# Altium footprint library PCB_CONNECTORS.PcbLib: 676 footprints (part 5 of 43)
Each footprint in its own frame and in the unit in brackets; x right, y up, seen from the top. Pads: shape width x height; smd on the part's side, far side on the other; paste and mask are expansions set on the pad; w line width, h text height; cw(c..) or ccw(c..) is an arc to the next point about the centre after c.
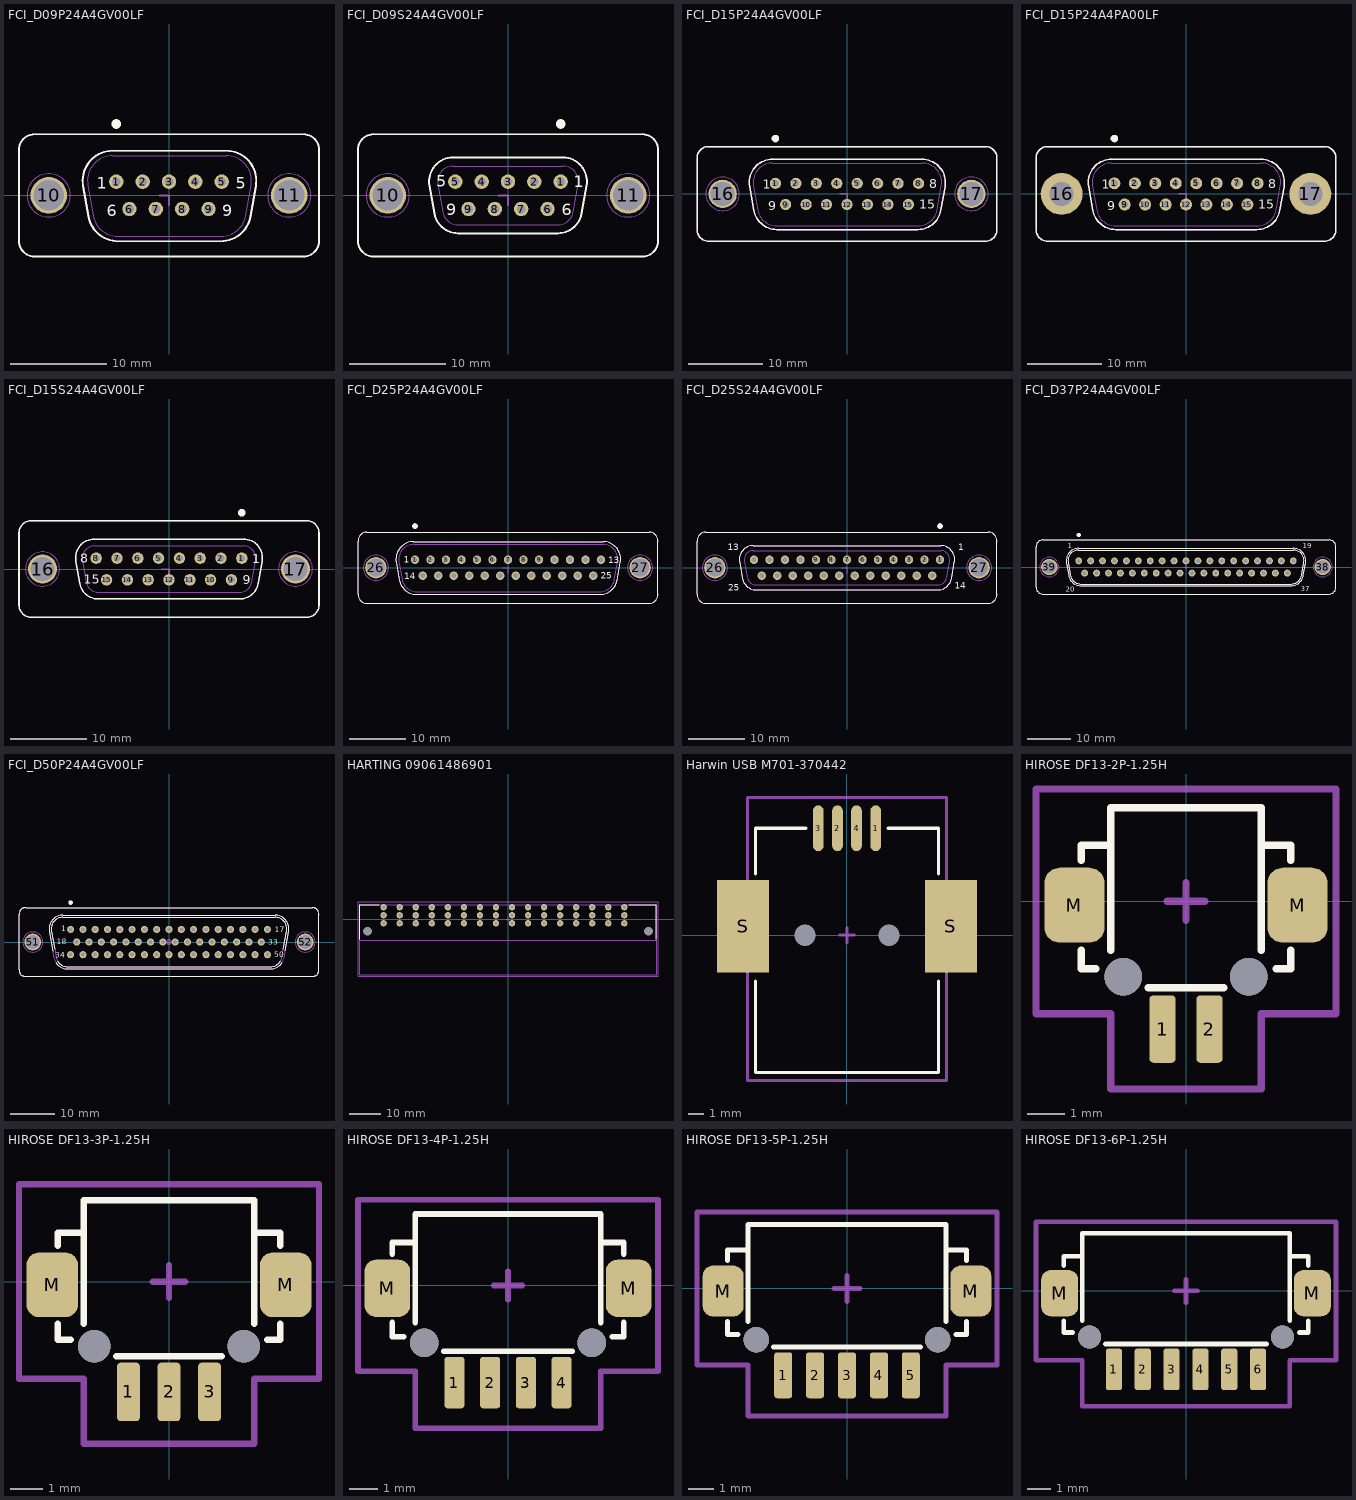
[diagram p4: the footprints below, top view; thin cyan lines are the x and y axes]

## FCI_D09P24A4GV00LF [mm] "Straight D-SUB 9 Male Contacts for PCB  with Harpoons and Female Screwlock (UNC4-40) and Elec. Continuity"
height 12.25
pads (11):
  round 1.5 hole 0.9: 1(-5.48,1.42) 2(-2.74,1.42) 3(0,1.42) 4(2.74,1.42) 5(5.48,1.42) 6(-4.11,-1.42) 7(-1.37,-1.42) 8(1.37,-1.42) 9(4.11,-1.42)
  round 3.8 hole 3.2: 10(-12.495,0) 11(12.495,0)
Top Overlay:
  circle w0.5: c-5.48,7.42 r0.25
  lines w0.2: -15.595,-4.75 ccw(c-13.995,-4.75) -13.995,-6.35 13.995,-6.35 ccw(c13.995,-4.75) 15.595,-4.75 15.595,4.75 ccw(c13.995,4.75) 13.995,6.35 -13.995,6.35 ccw(c-13.995,4.75) -15.595,4.75 -15.595,-4.75 ; -8.928,0.978 cw(c-5.855,1.52) -5.855,4.64 5.955,4.64 cw(c5.955,1.52) 9.028,0.978 8.469,-2.192 cw(c5.396,-1.65) 5.396,-4.77 -5.296,-4.77 cw(c-5.296,-1.65) -8.369,-2.192 -8.928,0.978
  text "9" at 5.535,-2.17 h1.2
  text "1" at -7.505,0.67 h1.2
  text "5" at 6.93,0.695 h1.2
  text "6" at -6.46,-2.17 h1.2
Mechanical 8:
  lines w0.2: -1,0 0,0 0,-1
Mechanical 14:
  circle w0.1: c12.495,0 r2.25
  circle w0.1: c-12.495,0 r2.25
  lines w0.1: -15.595,-4.75 ccw(c-13.995,-4.75) -13.995,-6.35 13.995,-6.35 ccw(c13.995,-4.75) 15.595,-4.75 15.595,4.75 ccw(c13.995,4.75) 13.995,6.35 -13.995,6.35 ccw(c-13.995,4.75) -15.595,4.75 -15.595,-4.75 ; -8.928,0.978 cw(c-5.855,1.52) -5.855,4.64 5.955,4.64 cw(c5.955,1.52) 9.028,0.978 8.469,-2.192 cw(c5.396,-1.65) 5.396,-4.77 -5.296,-4.77 cw(c-5.296,-1.65) -8.369,-2.192 -8.928,0.978 ; -8.435,1.065 cw(c-5.855,1.52) -5.855,4.14 5.955,4.14 cw(c5.955,1.52) 8.535,1.065 7.976,-2.105 cw(c5.396,-1.65) 5.396,-4.27 -5.296,-4.27 cw(c-5.296,-1.65) -7.876,-2.105 -8.435,1.065
  text "9 D-Sub Male" at -6.053,4.872 h1.2
  text "6" at -6.46,-2.17 h1.2
  text "5" at 6.93,0.695 h1.2
  text "1" at -7.505,0.67 h1.2
  text "9" at 5.535,-2.17 h1.2
3D body "FCI_D09P24A4GV00LF.stp": height 12, standoff -3, extent -15.495,-6.275 15.495,6.275

## FCI_D09S24A4GV00LF [mm] "Straight D-SUB 9 Female Contacts for PCB  with Harpoons and Female Screwlock (UNC4-40) and Elec. Continuity"
height 12.39
pads (11):
  round 1.5 hole 0.9: 1(5.48,1.42) 2(2.74,1.42) 3(0,1.42) 4(-2.74,1.42) 5(-5.48,1.42) 6(4.11,-1.42) 7(1.37,-1.42) 8(-1.37,-1.42) 9(-4.11,-1.42)
  round 3.8 hole 3.2: 10(-12.495,0) 11(12.495,0)
Top Overlay:
  circle w0.5: c5.48,7.42 r0.25
  lines w0.2: -15.595,-4.75 ccw(c-13.995,-4.75) -13.995,-6.35 13.995,-6.35 ccw(c13.995,-4.75) 15.595,-4.75 15.595,4.75 ccw(c13.995,4.75) 13.995,6.35 -13.995,6.35 ccw(c-13.995,4.75) -15.595,4.75 -15.595,-4.75 ; -8.167,1.011 cw(c-5.705,1.445) -5.705,3.945 5.705,3.945 cw(c5.705,1.445) 8.167,1.011 7.657,-1.879 cw(c5.195,-1.445) 5.195,-3.945 -5.195,-3.945 cw(c-5.195,-1.445) -7.657,-1.879 -8.167,1.011
  text "9" at -6.41,-2.045 h1.2
  text "6" at 5.585,-2.045 h1.2
  text "5" at -7.48,0.895 h1.2
  text "1" at 6.855,0.82 h1.2
Mechanical 8:
  lines w0.2: -1,0 0,0 0,-1
Mechanical 14:
  circle w0.1: c-12.495,0 r2.25
  circle w0.1: c12.495,0 r2.25
  lines w0.1: -15.595,-4.75 ccw(c-13.995,-4.75) -13.995,-6.35 13.995,-6.35 ccw(c13.995,-4.75) 15.595,-4.75 15.595,4.75 ccw(c13.995,4.75) 13.995,6.35 -13.995,6.35 ccw(c-13.995,4.75) -15.595,4.75 -15.595,-4.75 ; -8.167,1.011 cw(c-5.705,1.445) -5.705,3.945 5.705,3.945 cw(c5.705,1.445) 8.167,1.011 7.657,-1.879 cw(c5.195,-1.445) 5.195,-3.945 -5.195,-3.945 cw(c-5.195,-1.445) -7.657,-1.879 -8.167,1.011 ; -7.291,1.167 cw(c-5.715,1.445) -5.715,3.045 5.715,3.045 cw(c5.715,1.445) 7.291,1.167 6.781,-1.723 cw(c5.205,-1.445) 5.205,-3.045 -5.205,-3.045 cw(c-5.205,-1.445) -6.781,-1.723 -7.291,1.167
  text "1" at 8.85,1 h1.2
  text "5" at -9.525,1 h1.2
  text "6" at 8.525,-2.05 h1.2
  text "9" at -9.5,-2.025 h1.2
  text "9 D-Sub Female" at -6.178,4.472 h1.2
3D body "FCI_D09S24A4GV00LF.stp": height 12.1, standoff -3, extent -15.495,-6.653 15.495,6.21

## FCI_D15P24A4GV00LF [mm] "Straight D-SUB 15 Male Contacts for PCB  with Harpoons and Female Screwlock (UNC4-40) and Elec. Continuity"
height 12.25
pads (17):
  round 1.5 hole 0.9: 1(-9.59,1.42) 2(-6.85,1.42) 3(-4.11,1.42) 4(-1.37,1.42) 5(1.37,1.42) 6(4.11,1.42) 7(6.85,1.42) 8(9.59,1.42) 9(-8.22,-1.42) 10(-5.48,-1.42) 11(-2.74,-1.42) 12(0,-1.42) 13(2.74,-1.42) 14(5.48,-1.42) 15(8.22,-1.42)
  round 3.8 hole 3.2: 16(-16.66,0) 17(16.66,0)
Top Overlay:
  circle w0.5: c-9.59,7.42 r0.25
  lines w0.2: -20.095,-4.75 ccw(c-18.495,-4.75) -18.495,-6.35 18.495,-6.35 ccw(c18.495,-4.75) 20.095,-4.75 20.095,4.75 ccw(c18.495,4.75) 18.495,6.35 -18.495,6.35 ccw(c-18.495,4.75) -20.095,4.75 -20.095,-4.75 ; -13.038,0.978 cw(c-9.965,1.52) -9.965,4.64 10.065,4.64 cw(c10.065,1.52) 13.138,0.978 12.579,-2.192 cw(c9.506,-1.65) 9.506,-4.77 -9.406,-4.77 cw(c-9.406,-1.65) -12.479,-2.192 -13.038,0.978
  text "8" at 11.04,0.77 h1.2
  text "9" at -10.52,-2.17 h1.2
  text "1" at -11.29,0.67 h1.2
  text "15" at 9.695,-1.995 h1.2
Mechanical 8:
  lines w0.2: -1,0 0,0 0,-1
Mechanical 14:
  circle w0.1: c-16.66,0 r2.25
  circle w0.1: c16.66,0 r2.25
  lines w0.1: -20.095,-4.75 ccw(c-18.495,-4.75) -18.495,-6.35 18.495,-6.35 ccw(c18.495,-4.75) 20.095,-4.75 20.095,4.75 ccw(c18.495,4.75) 18.495,6.35 -18.495,6.35 ccw(c-18.495,4.75) -20.095,4.75 -20.095,-4.75 ; -13.038,0.978 cw(c-9.965,1.52) -9.965,4.64 10.065,4.64 cw(c10.065,1.52) 13.138,0.978 12.579,-2.192 cw(c9.506,-1.65) 9.506,-4.77 -9.406,-4.77 cw(c-9.406,-1.65) -12.479,-2.192 -13.038,0.978 ; -12.545,1.065 cw(c-9.965,1.52) -9.965,4.14 10.065,4.14 cw(c10.065,1.52) 12.645,1.065 12.086,-2.105 cw(c9.506,-1.65) 9.506,-4.27 -9.406,-4.27 cw(c-9.406,-1.65) -11.986,-2.105 -12.545,1.065
  text "15 D-Sub Male" at -6.028,4.847 h1.2
  text "15" at 9.695,-1.995 h1.2
  text "1" at -11.29,0.67 h1.2
  text "9" at -10.52,-2.17 h1.2
  text "8" at 11.04,0.77 h1.2
3D body "FCI_D15P24A4GV00LF.stp": height 12, standoff -3, extent -19.66,-6.275 19.66,6.275

## FCI_D15P24A4PA00LF [mm] "Straight D-SUB 15 Male Contacts for PCB  without Harpoons and without Female Screwlock"
height 12.25
pads (17):
  round 1.6 hole 0.9: 1(-9.59,1.42) 2(-6.85,1.42) 3(-4.11,1.42) 4(-1.37,1.42) 5(1.37,1.42) 6(4.11,1.42) 7(6.85,1.42) 8(9.59,1.42) 9(-8.22,-1.42) 10(-5.48,-1.42) 11(-2.74,-1.42) 12(0,-1.42) 13(2.74,-1.42) 14(5.48,-1.42) 15(8.22,-1.42)
  round 5.6 hole 3.2: 16(-16.66,0) 17(16.66,0)
Top Overlay:
  circle w0.5: c-9.59,7.42 r0.25
  lines w0.2: -20.095,-4.75 ccw(c-18.495,-4.75) -18.495,-6.35 18.495,-6.35 ccw(c18.495,-4.75) 20.095,-4.75 20.095,4.75 ccw(c18.495,4.75) 18.495,6.35 -18.495,6.35 ccw(c-18.495,4.75) -20.095,4.75 -20.095,-4.75 ; -13.038,0.978 cw(c-9.965,1.52) -9.965,4.64 10.065,4.64 cw(c10.065,1.52) 13.138,0.978 12.579,-2.192 cw(c9.506,-1.65) 9.506,-4.77 -9.406,-4.77 cw(c-9.406,-1.65) -12.479,-2.192 -13.038,0.978
  text "15" at 9.695,-1.995 h1.2
  text "1" at -11.29,0.67 h1.2
  text "9" at -10.52,-2.17 h1.2
  text "8" at 11.04,0.77 h1.2
Mechanical 8:
  lines w0.2: -1,0 0,0 0,-1
Mechanical 14:
  circle w0.1: c16.66,0 r2.25
  circle w0.1: c-16.66,0 r2.25
  lines w0.1: -20.095,-4.75 ccw(c-18.495,-4.75) -18.495,-6.35 18.495,-6.35 ccw(c18.495,-4.75) 20.095,-4.75 20.095,4.75 ccw(c18.495,4.75) 18.495,6.35 -18.495,6.35 ccw(c-18.495,4.75) -20.095,4.75 -20.095,-4.75 ; -13.038,0.978 cw(c-9.965,1.52) -9.965,4.64 10.065,4.64 cw(c10.065,1.52) 13.138,0.978 12.579,-2.192 cw(c9.506,-1.65) 9.506,-4.77 -9.406,-4.77 cw(c-9.406,-1.65) -12.479,-2.192 -13.038,0.978 ; -12.545,1.065 cw(c-9.965,1.52) -9.965,4.14 10.065,4.14 cw(c10.065,1.52) 12.645,1.065 12.086,-2.105 cw(c9.506,-1.65) 9.506,-4.27 -9.406,-4.27 cw(c-9.406,-1.65) -11.986,-2.105 -12.545,1.065
  text "8" at 11.04,0.77 h1.2
  text "9" at -10.52,-2.17 h1.2
  text "1" at -11.29,0.67 h1.2
  text "15" at 9.695,-1.995 h1.2
  text "15 D-Sub Male" at -6.028,4.847 h1.2
3D body "FCI_D15P24A4PA00LF.stp": height 11.9, standoff -2, extent -19.66,-6.275 19.66,6.275

## FCI_D15S24A4GV00LF [mm] "Straight D-SUB 15 Female Contacts for PCB  with Harpoons and Female Screwlock (UNC4-40) and Elec. Continuity"
height 12.39
pads (17):
  round 1.5 hole 0.9: 1(9.59,1.42) 2(6.85,1.42) 3(4.11,1.42) 4(1.37,1.42) 5(-1.37,1.42) 6(-4.11,1.42) 7(-6.85,1.42) 8(-9.59,1.42) 9(8.22,-1.42) 10(5.48,-1.42) 11(2.74,-1.42) 12(0,-1.42) 13(-2.74,-1.42) 14(-5.48,-1.42) 15(-8.22,-1.42)
  round 3.8 hole 3.2: 16(-16.66,0) 17(16.66,0)
Top Overlay:
  circle w0.5: c9.59,7.42 r0.25
  lines w0.2: -19.76,-4.75 ccw(c-18.16,-4.75) -18.16,-6.35 18.16,-6.35 ccw(c18.16,-4.75) 19.76,-4.75 19.76,4.75 ccw(c18.16,4.75) 18.16,6.35 -18.16,6.35 ccw(c-18.16,4.75) -19.76,4.75 -19.76,-4.75 ; -12.277,1.011 cw(c-9.815,1.445) -9.815,3.945 9.815,3.945 cw(c9.815,1.445) 12.277,1.011 11.767,-1.879 cw(c9.305,-1.445) 9.305,-3.945 -9.305,-3.945 cw(c-9.305,-1.445) -11.767,-1.879 -12.277,1.011
  text "9" at 9.695,-1.995 h1.2
  text "1" at 10.965,0.77 h1.2
  text "8" at -11.69,0.82 h1.2
  text "15" at -11.22,-1.945 h1.2
Mechanical 8:
  lines w0.2: -1,0 0,0 0,-1
Mechanical 14:
  circle w0.1: c-16.66,0 r2.25
  circle w0.1: c16.66,0 r2.25
  lines w0.1: -19.76,-4.75 ccw(c-18.16,-4.75) -18.16,-6.35 18.16,-6.35 ccw(c18.16,-4.75) 19.76,-4.75 19.76,4.75 ccw(c18.16,4.75) 18.16,6.35 -18.16,6.35 ccw(c-18.16,4.75) -19.76,4.75 -19.76,-4.75 ; -12.277,1.011 cw(c-9.815,1.445) -9.815,3.945 9.815,3.945 cw(c9.815,1.445) 12.277,1.011 11.767,-1.879 cw(c9.305,-1.445) 9.305,-3.945 -9.305,-3.945 cw(c-9.305,-1.445) -11.767,-1.879 -12.277,1.011 ; -11.401,1.167 cw(c-9.825,1.445) -9.825,3.045 9.825,3.045 cw(c9.825,1.445) 11.401,1.167 10.891,-1.723 cw(c9.315,-1.445) 9.315,-3.045 -9.315,-3.045 cw(c-9.315,-1.445) -10.891,-1.723 -11.401,1.167
  text "15" at -14.17,-2.045 h1.2
  text "8" at -13.715,0.945 h1.2
  text "1" at 12.99,1.095 h1.2
  text "9" at 12.845,-2.07 h1.2
  text "15 D-Sub Female" at -6.278,4.522 h1.2
3D body "FCI_D15S24A4GV00LF.stp": height 12.1, standoff -3, extent -19.66,-6.275 19.66,6.275

## FCI_D25P24A4GV00LF [mm] "Straight D-SUB 25 Male Contacts for PCB  with Harpoons and Female Screwlock (UNC4-40) and Elec. Continuity"
height 12.05
pads (27):
  round 1.5 hole 0.9: 1(-16.56,1.42) 2(-13.8,1.42) 3(-11.04,1.42) 4(-8.28,1.42) 5(-5.52,1.42) 6(-2.76,1.42) 7(0,1.42) 8(2.76,1.42) 9(5.52,1.42) 10(8.28,1.42) 11(11.04,1.42) 12(13.8,1.42) 13(16.56,1.42) 14(-15.18,-1.42) 15(-12.42,-1.42) 16(-9.66,-1.42) 17(-6.9,-1.42) 18(-4.14,-1.42) 19(-1.38,-1.42) 20(1.38,-1.42) 21(4.14,-1.42) 22(6.9,-1.42) 23(9.66,-1.42) 24(12.42,-1.42) 25(15.18,-1.42)
  round 3.8 hole 3.2: 26(-23.52,0) 27(23.52,0)
Top Overlay:
  circle w0.5: c-16.56,7.42 r0.25
  lines w0.2: -26.705,-4.75 ccw(c-25.105,-4.75) -25.105,-6.35 25.105,-6.35 ccw(c25.105,-4.75) 26.705,-4.75 26.705,4.75 ccw(c25.105,4.75) 25.105,6.35 -25.105,6.35 ccw(c-25.105,4.75) -26.705,4.75 -26.705,-4.75 ; -19.903,0.978 cw(c-16.83,1.52) -16.83,4.64 16.93,4.64 cw(c16.93,1.52) 20.003,0.978 19.444,-2.192 cw(c16.371,-1.65) 16.371,-4.77 -16.271,-4.77 cw(c-16.271,-1.65) -19.344,-2.192 -19.903,0.978
  text "25" at 16.55,-1.925 h1.2
  text "1" at -18.575,0.85 h1.2
  text "13" at 17.825,0.825 h1.2
  text "14" at -18.475,-2.05 h1.2
Mechanical 8:
  lines w0.2: -1,0 0,0 0,-1
Mechanical 14:
  circle w0.1: c23.52,0 r2.25
  circle w0.1: c-23.52,0 r2.25
  lines w0.1: -26.705,-4.75 ccw(c-25.105,-4.75) -25.105,-6.35 25.105,-6.35 ccw(c25.105,-4.75) 26.705,-4.75 26.705,4.75 ccw(c25.105,4.75) 25.105,6.35 -25.105,6.35 ccw(c-25.105,4.75) -26.705,4.75 -26.705,-4.75 ; -19.903,0.978 cw(c-16.83,1.52) -16.83,4.64 16.93,4.64 cw(c16.93,1.52) 20.003,0.978 19.444,-2.192 cw(c16.371,-1.65) 16.371,-4.77 -16.271,-4.77 cw(c-16.271,-1.65) -19.344,-2.192 -19.903,0.978 ; -19.41,1.065 cw(c-16.83,1.52) -16.83,4.14 16.93,4.14 cw(c16.93,1.52) 19.51,1.065 18.951,-2.105 cw(c16.371,-1.65) 16.371,-4.27 -16.271,-4.27 cw(c-16.271,-1.65) -18.851,-2.105 -19.41,1.065
  text "25 D-Sub Male" at -6.478,4.872 h1.2
  text "14" at -18.475,-2.05 h1.2
  text "13" at 17.5,0.875 h1.2
  text "1" at -18.575,0.85 h1.2
  text "25" at 16.55,-1.925 h1.2
3D body "FCI_D25P24A4GV00LF.stp": height 12, standoff -3, extent -26.52,-6.275 26.52,6.275

## FCI_D25S24A4GV00LF [mm] "Straight D-SUB 25 Female Contacts for PCB  with Harpoons and Female Screwlock (UNC4-40) and Elec. Continuity"
height 12.39
pads (27):
  round 1.5 hole 0.9: 1(16.56,1.42) 2(13.8,1.42) 3(11.04,1.42) 4(8.28,1.42) 5(5.52,1.42) 6(2.76,1.42) 7(0,1.42) 8(-2.76,1.42) 9(-5.52,1.42) 10(-8.28,1.42) 11(-11.04,1.42) 12(-13.8,1.42) 13(-16.56,1.42) 14(15.18,-1.42) 15(12.42,-1.42) 16(9.66,-1.42) 17(6.9,-1.42) 18(4.14,-1.42) 19(1.38,-1.42) 20(-1.38,-1.42) 21(-4.14,-1.42) 22(-6.9,-1.42) 23(-9.66,-1.42) 24(-12.42,-1.42) 25(-15.18,-1.42)
  round 3.8 hole 3.2: 26(-23.52,0) 27(23.52,0)
Top Overlay:
  circle w0.5: c16.56,7.42 r0.25
  lines w0.2: -26.705,-4.75 ccw(c-25.105,-4.75) -25.105,-6.35 25.105,-6.35 ccw(c25.105,-4.75) 26.705,-4.75 26.705,4.75 ccw(c25.105,4.75) 25.105,6.35 -25.105,6.35 ccw(c-25.105,4.75) -26.705,4.75 -26.705,-4.75 ; -19.137,1.011 cw(c-16.675,1.445) -16.675,3.945 16.675,3.945 cw(c16.675,1.445) 19.137,1.011 18.627,-1.879 cw(c16.165,-1.445) 16.165,-3.945 -16.165,-3.945 cw(c-16.165,-1.445) -18.627,-1.879 -19.137,1.011
  text "25" at -21.1,-4.1 h1.2
  text "14" at 19.2,-3.75 h1.2
  text "1" at 19.775,3.1 h1.2
  text "13" at -21.225,3.125 h1.2
Mechanical 8:
  lines w0.2: -1,0 0,0 0,-1
Mechanical 14:
  circle w0.1: c-23.52,0 r2.25
  circle w0.1: c23.52,0 r2.25
  lines w0.1: -26.705,-4.75 ccw(c-25.105,-4.75) -25.105,-6.35 25.105,-6.35 ccw(c25.105,-4.75) 26.705,-4.75 26.705,4.75 ccw(c25.105,4.75) 25.105,6.35 -25.105,6.35 ccw(c-25.105,4.75) -26.705,4.75 -26.705,-4.75 ; -19.137,1.011 cw(c-16.675,1.445) -16.675,3.945 16.675,3.945 cw(c16.675,1.445) 19.137,1.011 18.627,-1.879 cw(c16.165,-1.445) 16.165,-3.945 -16.165,-3.945 cw(c-16.165,-1.445) -18.627,-1.879 -19.137,1.011 ; -18.261,1.167 cw(c-16.685,1.445) -16.685,3.045 16.685,3.045 cw(c16.685,1.445) 18.261,1.167 17.751,-1.723 cw(c16.175,-1.445) 16.175,-3.045 -16.175,-3.045 cw(c-16.175,-1.445) -17.751,-1.723 -18.261,1.167
  text "13" at -21.225,3.125 h1.2
  text "1" at 19.775,3.1 h1.2
  text "14" at 19.2,-3.75 h1.2
  text "25" at -21.1,-4.1 h1.2
  text "25 D-Sub Female" at -6.328,4.497 h1.2
3D body "FCI_D25S24A4GV00LF.stp": height 12.1, standoff -3, extent -26.52,-6.275 26.52,6.275

## FCI_D37P24A4GV00LF [mm] "Straight D-SUB 37 Male Contacts for PCB  with Harpoons and Female Screwlock (UNC4-40) and Elec. Continuity"
height 12.05
pads (39):
  round 1.6 hole 0.9: 1(-24.93,1.42) 2(-22.16,1.42) 3(-19.39,1.42) 4(-16.62,1.42) 5(-13.85,1.42) 6(-11.08,1.42) 7(-8.31,1.42) 8(-5.54,1.42) 9(-2.77,1.42) 10(0,1.42) 11(2.77,1.42) 12(5.54,1.42) 13(8.31,1.42) 14(11.08,1.42) 15(13.85,1.42) 16(16.62,1.42) 17(19.39,1.42) 18(22.16,1.42) 19(24.93,1.42) 20(-23.545,-1.42) 21(-20.775,-1.42) 22(-18.005,-1.42) 23(-15.235,-1.42) 24(-12.465,-1.42) 25(-9.695,-1.42) 26(-6.925,-1.42) 27(-4.155,-1.42) 28(-1.385,-1.42) 29(1.385,-1.42) 30(4.155,-1.42) 31(6.925,-1.42) 32(9.695,-1.42) 33(12.465,-1.42) 34(15.235,-1.42) 35(18.005,-1.42) 36(20.775,-1.42) 37(23.545,-1.42)
  round 3.8 hole 3.1: 38(31.75,0) 39(-31.75,0)
Top Overlay:
  circle w0.5: c-24.93,7.42 r0.25
  lines w0.2: -34.85,-4.675 ccw(c-33.25,-4.675) -33.25,-6.275 33.25,-6.275 ccw(c33.25,-4.675) 34.85,-4.675 34.85,4.675 ccw(c33.25,4.675) 33.25,6.275 -33.25,6.275 ccw(c-33.25,4.675) -34.85,4.675 -34.85,-4.675 ; -27.776,0.946 cw(c-24.92,1.45) -24.92,4.35 24.92,4.35 cw(c24.92,1.45) 27.776,0.946 27.265,-1.954 cw(c24.409,-1.45) 24.409,-4.35 -24.409,-4.35 cw(c-24.409,-1.45) -27.265,-1.954 -27.776,0.946 ; -27.382,1.016 cw(c-24.92,1.45) -24.92,3.95 24.92,3.95 cw(c24.92,1.45) 27.382,1.016 26.871,-1.884 cw(c24.409,-1.45) 24.409,-3.95 -24.409,-3.95 cw(c-24.409,-1.45) -26.871,-1.884 -27.382,1.016
  text "20" at -27.97,-5.692 h1.2
  text "1" at -27.475,4.393 h1.2
  text "19" at 27.093,4.393 h1.2
  text "37" at 26.609,-5.64 h1.2
Mechanical 8:
  drawing of 160 lines, arcs and shapes, not listed
Mechanical 14:
  circle w0.1: c-31.75,0 r2.25
  circle w0.1: c31.75,0 r2.25
  lines w0.1: -34.85,-4.675 ccw(c-33.25,-4.675) -33.25,-6.275 33.25,-6.275 ccw(c33.25,-4.675) 34.85,-4.675 34.85,4.675 ccw(c33.25,4.675) 33.25,6.275 -33.25,6.275 ccw(c-33.25,4.675) -34.85,4.675 -34.85,-4.675 ; -27.776,0.946 cw(c-24.92,1.45) -24.92,4.35 24.92,4.35 cw(c24.92,1.45) 27.776,0.946 27.265,-1.954 cw(c24.409,-1.45) 24.409,-4.35 -24.409,-4.35 cw(c-24.409,-1.45) -27.265,-1.954 -27.776,0.946 ; -27.382,1.016 cw(c-24.92,1.45) -24.92,3.95 24.92,3.95 cw(c24.92,1.45) 27.382,1.016 26.871,-1.884 cw(c24.409,-1.45) 24.409,-3.95 -24.409,-3.95 cw(c-24.409,-1.45) -26.871,-1.884 -27.382,1.016
  text "37" at 26.609,-5.64 h1.2
  text "19" at 27.093,4.393 h1.2
  text "1" at -27.475,4.393 h1.2
  text "20" at -27.97,-5.692 h1.2
  text "37 D-Sub Male" at -8.078,4.697 h1.2
3D body "FCI_D37P24A4GV00LF.stp": height 12, standoff -3.2, extent -34.85,-6.275 34.85,6.275

## FCI_D50P24A4GV00LF [mm] "Straight D-SUB 50 Male Contacts for PCB  with Harpoons and Female Screwlock (UNC4-40) and Elec. Continuity"
height 12.3
pads (52):
  round 1.6 hole 0.9: 1(-22.08,2.84) 2(-19.32,2.84) 3(-16.56,2.84) 4(-13.8,2.84) 5(-11.04,2.84) 6(-8.28,2.84) 7(-5.52,2.84) 8(-2.76,2.84) 9(0,2.84) 10(2.76,2.84) 11(5.52,2.84) 12(8.28,2.84) 13(11.04,2.84) 14(13.8,2.84) 15(16.56,2.84) 16(19.32,2.84) 17(22.08,2.84) 18(-20.7,0) 19(-17.94,0) 20(-15.18,0) 21(-12.42,0) 22(-9.66,0) 23(-6.9,0) 24(-4.14,0) 25(-1.38,0) 26(1.38,0) 27(4.14,0) 28(6.9,0) 29(9.66,0) 30(12.42,0) 31(15.18,0) 32(17.94,0) 33(20.7,0) 34(-22.08,-2.84) 35(-19.32,-2.84) 36(-16.56,-2.84) 37(-13.8,-2.84) 38(-11.04,-2.84) 39(-8.28,-2.84) 40(-5.52,-2.84) 41(-2.76,-2.84) 42(0,-2.84) 43(2.76,-2.84) 44(5.52,-2.84) 45(8.28,-2.84) 46(11.04,-2.84) 47(13.8,-2.84) 48(16.56,-2.84) 49(19.32,-2.84) 50(22.08,-2.84)
  round 3.8 hole 3.1: 51(-30.55,0) 52(30.55,0)
Top Overlay:
  circle w0.5: c-22.08,8.84 r0.25
  lines w0.2: -26.063,-2.11 -26.858,2.397 cw(c-23.805,2.935) -23.805,6.035 23.805,6.035 cw(c23.805,2.935) 26.858,2.397 26.082,-2.004 ; -25.647,-1.592 -26.366,2.484 cw(c-23.805,2.935) -23.805,5.535 23.805,5.535 cw(c23.805,2.935) 26.366,2.484 25.65,-1.575 ; -25.455,-4.485 ccw(c-22.77,-2.935) -22.77,-6.035 22.77,-6.035 ccw(c22.77,-2.935) 25.455,-4.485 ; -25.022,-4.235 ccw(c-22.77,-2.935) -22.77,-5.535 22.77,-5.535 ccw(c22.77,-2.935) 25.022,-4.235 ; -33.655,-6.23 ccw(c-32.155,-6.23) -32.155,-7.73 32.155,-7.73 ccw(c32.155,-6.23) 33.655,-6.23 33.655,6.23 ccw(c32.155,6.23) 32.155,7.73 -32.155,7.73 ccw(c-32.155,6.23) -33.655,6.23 -33.655,-6.23
  text "18" at -25.15,-0.55 h1.2
  text "34" at -25.515,-3.56 h1.2
  text "50" at 23.6,-3.45 h1.2
  text "33" at 22.275,-0.575 h1.2
  text "1" at -24.225,2.4 h1.2
  text "17" at 23.685,2.25 h1.2
Mechanical 8:
  drawing of 213 lines, arcs and shapes, not listed
Mechanical 14:
  circle w0.1: c-30.55,0 r2.25
  circle w0.1: c30.55,0 r2.25
  lines w0.1: -33.655,-6.23 ccw(c-32.155,-6.23) -32.155,-7.73 32.155,-7.73 ccw(c32.155,-6.23) 33.655,-6.23 33.655,6.23 ccw(c32.155,6.23) 32.155,7.73 -32.155,7.73 ccw(c-32.155,6.23) -33.655,6.23 -33.655,-6.23 ; -26.858,2.397 cw(c-23.805,2.935) -23.805,6.035 23.805,6.035 cw(c23.805,2.935) 26.858,2.397 25.823,-3.473 cw(c22.77,-2.935) 22.77,-6.035 -22.77,-6.035 cw(c-22.77,-2.935) -25.823,-3.473 -26.858,2.397 ; -26.366,2.484 cw(c-23.805,2.935) -23.805,5.535 23.805,5.535 cw(c23.805,2.935) 26.366,2.484 25.33,-3.386 cw(c22.77,-2.935) 22.77,-5.535 -22.77,-5.535 cw(c-22.77,-2.935) -25.33,-3.386 -26.366,2.484
  text "1" at -24.225,2.4 h1.2
  text "33" at 22.275,-0.575 h1.2
  text "50" at 23.6,-3.45 h1.2
  text "34" at -25.515,-3.56 h1.2
  text "18" at -25.15,-0.55 h1.2
  text "50 D-Sub Male" at -8.053,6.247 h1.2
  text "17" at 23.685,2.25 h1.2
3D body "FCI_D50P24A4GV00LF.stp": height 12, standoff -3.2, extent -33.655,-7.73 33.655,7.73

## HARTING 09061486901 [mm]
height 11.25
pads (50):
  round 2 hole 1: B1(36.83,1.27) B2(31.75,1.27) B3(26.67,1.27) B4(21.59,1.27) B5(16.51,1.27) B6(11.43,1.27) B7(6.35,1.27) B8(1.27,1.27) B9(-3.81,1.27) B10(-8.89,1.27) B11(-13.97,1.27) B12(-19.05,1.27) B13(-24.13,1.27) B14(-29.21,1.27) B15(-34.29,1.27) B16(-39.37,1.27) D1(36.83,3.81) D2(31.75,3.81) D3(26.67,3.81) D4(21.59,3.81) D5(16.51,3.81) D6(11.43,3.81) D7(6.35,3.81) D8(1.27,3.81) D9(-3.81,3.81) D10(-8.89,3.81) D11(-13.97,3.81) D12(-19.05,3.81) D13(-24.13,3.81) D14(-29.21,3.81) D15(-34.29,3.81) D16(-39.37,3.81) Z1(36.83,-1.27) Z2(31.75,-1.27) Z3(26.67,-1.27) Z4(21.59,-1.27) Z5(16.51,-1.27) Z6(11.43,-1.27) Z7(6.35,-1.27) Z8(1.27,-1.27) Z9(-3.81,-1.27) Z10(-8.89,-1.27) Z11(-13.97,-1.27) Z12(-19.05,-1.27) Z13(-24.13,-1.27) Z14(-29.21,-1.27) Z15(-34.29,-1.27) Z16(-39.37,-1.27)
  round 0 hole 2.8 unplated: M(-44.45,-3.81) M(44.45,-3.81)
Top Overlay:
  lines w0.2: -46.99,-6.35 -46.99,4.6 -40.8,4.6 ; 38.3,4.6 46.99,4.6 46.99,-6.35
Mechanical 13:
  lines w0.2: -47,-6.57 -40.37,-6.57 41.23,-6.57 47,-6.57 ; -46.97,-17.51 -46.97,4.59 47.03,4.59 47.03,-17.51 -46.97,-17.51
Mechanical 15:
  lines w0.2: -0.5,0 0.5,0 ; 0,-0.5 0,0.5 ; -47.5,-18 47.5,-18 47.5,5.5 -47.5,5.5 -47.5,-18
3D body "Harting 09061486901.STEP": height 11.25, standoff -3.55, extent -46.97,-17.51 47.03,4.59

## Harwin USB M701-370442 [mm]
height 11
pads (8):
  oval 0.7x3 smd: 1(1.875,7) 2(-0.625,7) 3(-1.875,7) 4(0.625,7)
  rect 0x0 hole 1.4 unplated: M(-2.75,0) M(2.75,0)
  rect 3.4x6.04 smd: S(-6.8,0.58) S(6.8,0.58)
Top Overlay:
  lines w0.2: -6,-3 -6,-9 0,-9 6,-9 6,-3 ; -6,4 -6,7 -2.7,7 ; 2.7,7 6,7 6,4
Mechanical 15:
  lines w0.2: -0.5,0 0.5,0 ; 0,-0.5 0,0.5 ; -6.5,-9.5 -6.5,9 0,9 6.5,9 6.5,-9.5 0,-9.5 -6.5,-9.5
3D body "Harwin M701-370442.STEP": height 11, standoff -1.5, extent -8.1,-9 8.1,8.15

## HIROSE DF13-2P-1.25H [mm] "DF13 Series 1.25mm pitch miniature crimping connector single row"
height 3.6
pads (4):
  rrect30% 0.7x1.8 smd: 1(-0.625,-3.4) 2(0.625,-3.4)
  rrect50% 1.6x2 smd: M(-2.975,-0.1) M(2.975,-0.1)
via 1.675,-2 diameter 1 hole 1
via -1.675,-2 diameter 1 hole 1
Top Overlay:
  lines w0.2: -2.8,-1.3 -2.8,-1.8 -2.4,-1.8 ; -2.8,1.1 -2.8,1.5 -2,1.5 ; -2,-1.3 -2,2.5 0,2.5 2,2.5 2,-1.3 ; -1,-2.3 0,-2.3 1,-2.3 ; 2,1.5 2.8,1.5 2.8,1.1 ; 2.4,-1.8 2.8,-1.8 2.8,-1.3
Mechanical 15:
  lines w0.2: -0.5,0 0.5,0 ; 0,-0.5 0,0.5 ; -4,-3 -2,-3 -2,-5 0,-5 2,-5 2,-3 4,-3 4,2.5 4,3 0,3 -4,3 -4,2.5 -4,-3
3D body "DF13-2P-1.25H_X_8A_S_H_X_97_S__.STEP": height 3.59, standoff -0.81, extent -3.575,-3.9 3.575,2.6

## HIROSE DF13-3P-1.25H [mm] "DF13 Series 1.25mm pitch miniature crimping connector single row"
height 3.6
pads (5):
  rrect30% 0.7x1.8 smd: 1(-1.25,-3.4) 2(0,-3.4) 3(1.25,-3.4)
  rrect50% 1.6x2 smd: M(-3.6,-0.1) M(3.6,-0.1)
via 2.3,-2 diameter 1 hole 1
via -2.3,-2 diameter 1 hole 1
Top Overlay:
  lines w0.2: -3.425,-1.3 -3.425,-1.8 -3.025,-1.8 ; -3.425,1.1 -3.425,1.5 -2.625,1.5 ; -2.625,-1.3 -2.625,2.5 -0.625,2.5 1.375,2.5 2.625,2.5 2.625,-1.3 ; -1.625,-2.3 -0.625,-2.3 0,-2.3 0.625,-2.3 1.625,-2.3 ; 2.625,1.5 3.425,1.5 3.425,1.1 ; 3.025,-1.8 3.425,-1.8 3.425,-1.3
Mechanical 15:
  lines w0.2: -0.5,0 0.5,0 ; 0,-0.5 0,0.5 ; -4.625,-3 -2.625,-3 -2.625,-5 -0.625,-5 2.625,-5 2.625,-3 4.625,-3 4.625,2.5 4.625,3 3.375,3 -0.625,3 -4.625,3 -4.625,2.5 -4.625,-3
3D body "DF13-3P-1.25H_X_8A_S_H_X_97_S__.STEP": height 3.59, standoff -0.81, extent -4.2,-3.9 4.2,2.6

## HIROSE DF13-4P-1.25H [mm] "DF13 Series 1.25mm pitch miniature crimping connector single row"
height 3.6
pads (6):
  rrect30% 0.7x1.8 smd: 1(-1.875,-3.4) 2(-0.625,-3.4) 3(0.625,-3.4) 4(1.875,-3.4)
  rrect50% 1.6x2 smd: M(-4.225,-0.1) M(4.225,-0.1)
via -2.925,-2 diameter 1 hole 1
via 2.925,-2 diameter 1 hole 1
Top Overlay:
  lines w0.2: -4.05,-1.3 -4.05,-1.8 -3.65,-1.8 ; -4.05,1.1 -4.05,1.5 -3.25,1.5 ; -3.25,-1.3 -3.25,2.5 -1.25,2.5 2,2.5 3.25,2.5 3.25,-1.3 ; -2.25,-2.3 -1.25,-2.3 -0.625,-2.3 1.25,-2.3 2.25,-2.3 ; 3.25,1.5 4.05,1.5 4.05,1.1 ; 3.65,-1.8 4.05,-1.8 4.05,-1.3
Mechanical 15:
  lines w0.2: -0.5,0 0.5,0 ; 0,-0.5 0,0.5 ; -5.25,-3 -5.25,2.5 -5.25,3 -1.25,3 4,3 5.25,3 5.25,2.5 5.25,-3 3.25,-3 3.25,-5 -1.25,-5 -3.25,-5 -3.25,-3 -5.25,-3
3D body "DF13-4P-1.25H_X_8A_S_H_X_97_S__.STEP": height 3.59, standoff -0.81, extent -4.825,-3.9 4.825,2.6

## HIROSE DF13-5P-1.25H [mm] "DF13 Series 1.25mm pitch miniature crimping connector single row"
height 3.6
pads (7):
  rrect30% 0.7x1.8 smd: 1(-2.5,-3.4) 2(-1.25,-3.4) 3(0,-3.4) 4(1.25,-3.4) 5(2.5,-3.4)
  rrect50% 1.6x2 smd: M(-4.85,-0.1) M(4.85,-0.1)
via 3.55,-2 diameter 1 hole 1
via -3.55,-2 diameter 1 hole 1
Top Overlay:
  lines w0.2: -4.675,-1.3 -4.675,-1.8 -4.275,-1.8 ; -4.675,1.1 -4.675,1.5 -3.875,1.5 ; -3.875,-1.3 -3.875,2.5 -1.875,2.5 2.625,2.5 3.875,2.5 3.875,-1.3 ; -2.875,-2.3 -1.875,-2.3 -1.25,-2.3 1.875,-2.3 2.875,-2.3 ; 3.875,1.5 4.675,1.5 4.675,1.1 ; 4.275,-1.8 4.675,-1.8 4.675,-1.3
Mechanical 15:
  lines w0.2: -0.5,0 0.5,0 ; 0,-0.5 0,0.5 ; -5.875,-3 -3.875,-3 -3.875,-5 -1.875,-5 3.875,-5 3.875,-3 5.875,-3 5.875,2.5 5.875,3 4.625,3 -1.875,3 -5.875,3 -5.875,2.5 -5.875,-3
3D body "DF13-5P-1.25H_X_8A_S_H_X_97_S__.STEP": height 3.59, standoff -0.81, extent -5.45,-3.9 5.45,2.6

## HIROSE DF13-6P-1.25H [mm] "DF13 Series 1.25mm pitch miniature crimping connector single row"
height 3.6
pads (8):
  rrect30% 0.7x1.8 smd: 1(-3.125,-3.4) 2(-1.875,-3.4) 3(-0.625,-3.4) 4(0.625,-3.4) 5(1.875,-3.4) 6(3.125,-3.4)
  rrect50% 1.6x2 smd: M(-5.475,-0.1) M(5.475,-0.1)
via 4.175,-2 diameter 1 hole 1
via -4.175,-2 diameter 1 hole 1
Top Overlay:
  lines w0.2: -5.3,-1.3 -5.3,-1.8 -4.9,-1.8 ; -5.3,1.1 -5.3,1.5 -4.5,1.5 ; -4.5,-1.3 -4.5,2.5 -2.5,2.5 3.25,2.5 4.5,2.5 4.5,-1.3 ; -3.5,-2.3 -2.5,-2.3 -1.875,-2.3 1.8,-2.3 3.5,-2.3 ; 4.5,1.5 5.3,1.5 5.3,1.1 ; 4.9,-1.8 5.3,-1.8 5.3,-1.3
Mechanical 15:
  lines w0.2: -0.5,0 0.5,0 ; 0,-0.5 0,0.5 ; -6.5,-3 -4.5,-3 -4.5,-5 -2.5,-5 4.5,-5 4.5,-3 6.5,-3 6.5,2.5 6.5,3 5.25,3 -2.5,3 -6.5,3 -6.5,2.5 -6.5,-3
3D body "DF13-6P-1.25H_X_8A_S_H_X_97_S__.STEP": height 3.59, standoff -0.81, extent -6.075,-3.9 6.075,2.6